# Altium footprint library JL_PCB.PCBLIB: 1129 footprints (part 55 of 72)
Each footprint in its own frame and in the unit in brackets; x right, y up, seen from the top. Pads: shape width x height; smd on the part's side, far side on the other; paste and mask are expansions set on the pad; w line width, h text height; cw(c..) or ccw(c..) is an arc to the next point about the centre after c.
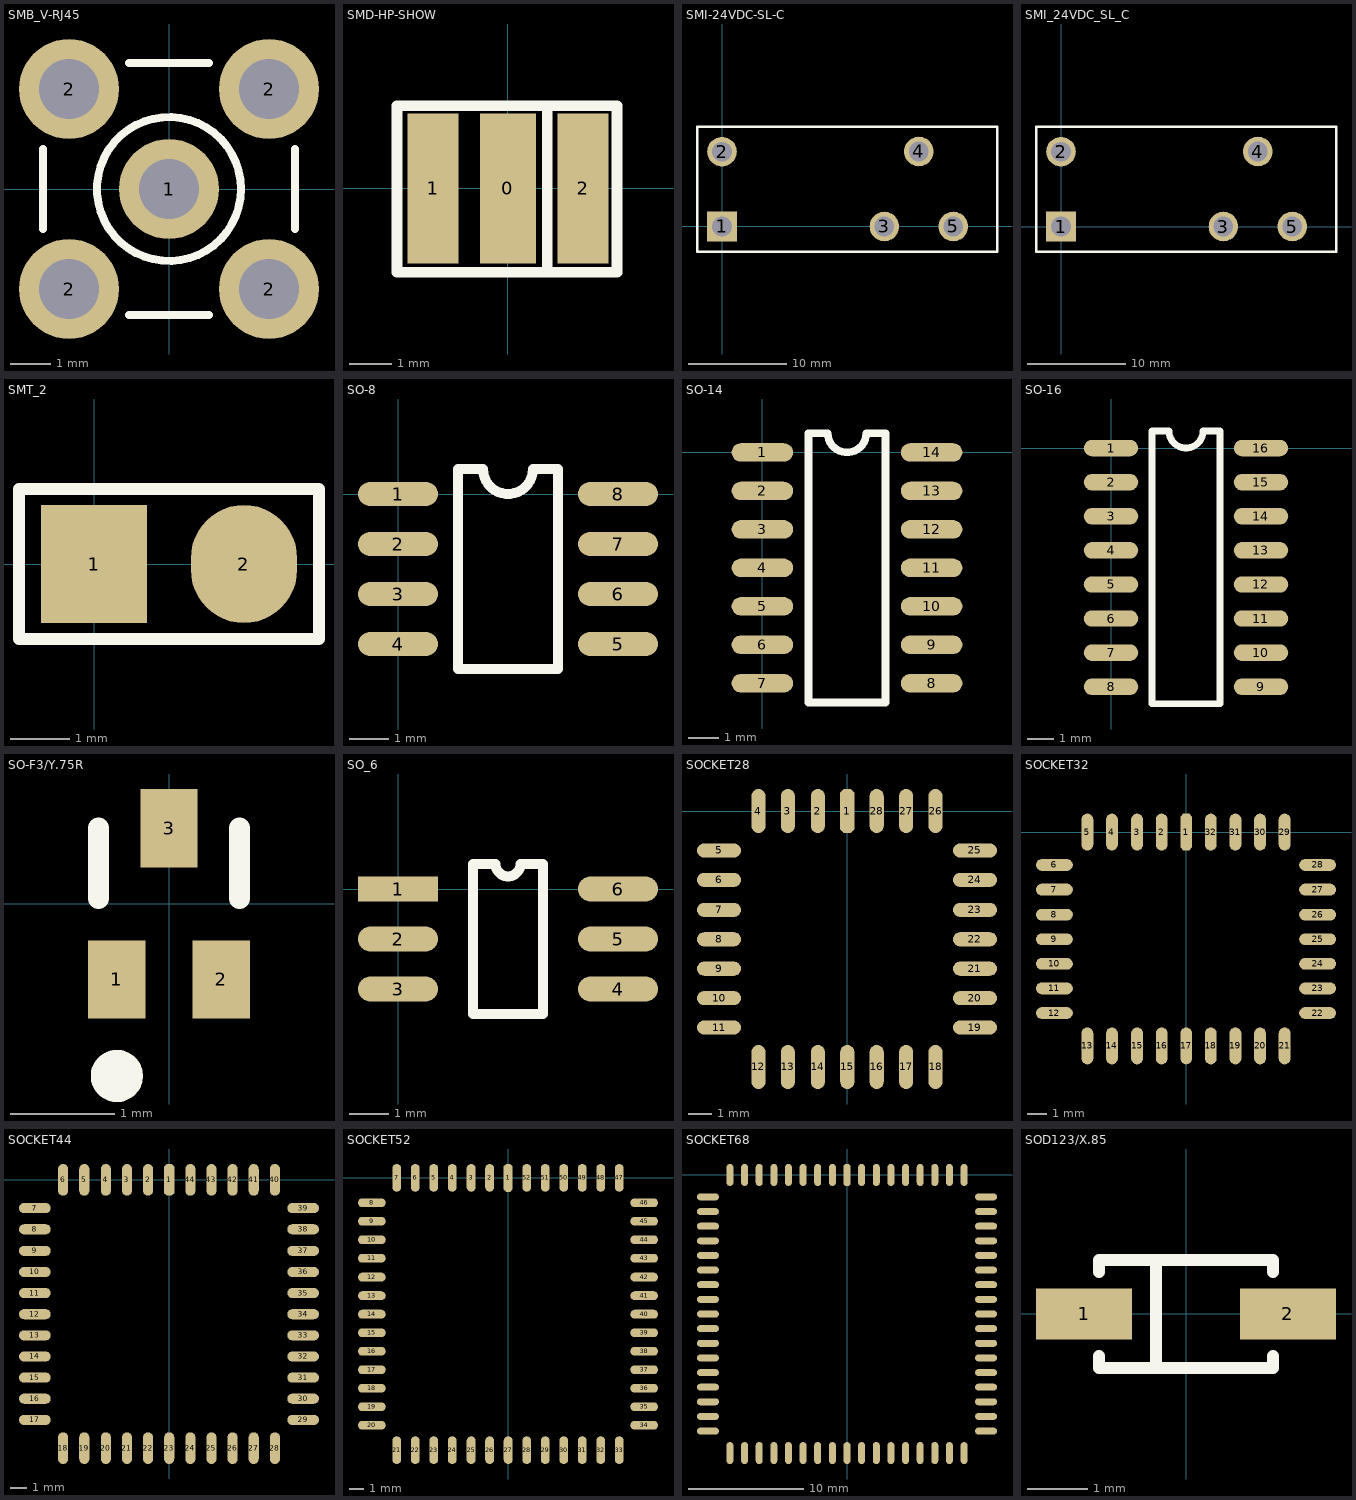
[diagram p54: the footprints below, top view; thin cyan lines are the x and y axes]

## SMB_V-RJ45 [mm] "Connector; SMB Straight"
pads (5):
  round 2.5 hole 1.5: 1(0,0) 2(-2.5,-2.5) 2(-2.5,2.5) 2(2.5,-2.5) 2(2.5,2.5)
TopOverlay:
  circle w0.2: c0,0 r1.8
  lines w0.2: -3.15,-1 -3.15,1 ; -1,-3.15 1,-3.15 ; -1,3.15 1,3.15 ; 3.15,-1 3.15,1
Mechanical1:
  circle w0.025: c0,0 r0.2
  circle w0.025: c0,0 r1.05
  circle w0.025: c0,0 r1.8

## SMD-HP-SHOW [mm]
pads (3):
  rect 1.3x3.5 smd: 0(0,0)
  rect 1.2x3.5 smd: 1(-1.75,0) 2(1.75,0)
TopOverlay:
  lines w0.254: 0.917,-1.958 0.917,1.928 ; -2.588,-1.958 2.543,-1.958 2.543,1.928 -2.588,1.928 -2.588,-1.958
3D body "SMD-HP-1W.STEP": height 2.03, standoff 0, extent -1.747,-1.755 1.753,1.745

## SMI-24VDC-SL-C [mm]
pads (5):
  rect 3x3 hole 2: 1(0,0)
  round 3 hole 2: 2(0,7.6) 3(16.5,0) 4(20,7.62) 5(23.5,0)
TopOverlay:
  lines w0.254: -2.54,-2.54 27.94,-2.54 27.94,10.16 -2.54,10.16 -2.54,-2.54

## SMI_24VDC_SL_C [mm]
pads (5):
  rect 3x3 hole 2: 1(0,0)
  round 3 hole 2: 2(0,7.6) 3(16.5,0) 4(20,7.62) 5(23.5,0)
TopOverlay:
  lines w0.254: -2.54,-2.54 27.94,-2.54 27.94,10.16 -2.54,10.16 -2.54,-2.54

## SMT_2 [mm] "Connector; Header; 2 Position"
pads (2):
  rect 1.8x2 smd: 1(0,0)
  oval 1.8x2 smd: 2(2.54,0)
TopOverlay:
  lines w0.2: -1.27,-1.27 3.81,-1.27 3.81,1.27 -1.27,1.27 -1.27,-1.27

## SO-8 [mil]
pads (8):
  oval 80x24 smd: 1(0,0) 2(0,-50) 3(0,-100) 4(0,-150) 5(220,-150) 6(220,-100) 7(220,-50) 8(220,0)
TopOverlay:
  lines w10: 60,-175 160,-175 160,25 135,25 cw(c110,25) 85,25 60,25 60,-175
3D body "SO-8.step": height 63.6, standoff 0.6, extent -10.91,-172 224.91,20.91

## SO-14 [mil]
pads (14):
  oval 80x24 smd: 1(0,0) 2(0,-50) 3(0,-100) 4(0,-150) 5(0,-200) 6(0,-250) 7(0,-300) 8(220,-300) 9(220,-250) 10(220,-200) 11(220,-150) 12(220,-100) 13(220,-50) 14(220,0)
TopOverlay:
  lines w10: 60,-325 60,25 85,25 ccw(c110,25) 135,25 160,25 160,-325 60,-325
3D body "SOIC14.STEP": height 76.77, standoff 0, extent -18.41,-321.26 220,21.26

## SO-16 [mil]
pads (16):
  oval 80x24 smd: 1(0,0) 2(0,-50) 3(0,-100) 4(0,-150) 5(0,-200) 6(0,-250) 7(0,-300) 8(0,-350) 9(220,-350) 10(220,-300) 11(220,-250) 12(220,-200) 13(220,-150) 14(220,-100) 15(220,-50) 16(220,0)
TopOverlay:
  lines w10: 60,-375 60,25 85,25 ccw(c110,25) 135,25 160,25 160,-375 60,-375
3D body "SOIC16.STEP": height 76.77, standoff 0, extent -12,-377 226.41,28.51

## SO-F3/Y.75R [mm] "SC-89; 3 Flat Leads; Body 1.6 x 1.6 x 0.7 mm, inc leads (LxWxH typ)"
height 0.8
pads (3):
  rect 0.55x0.75 smd: 1(-0.5,-0.725) 2(0.5,-0.725) 3(0,0.725)
TopOverlay:
  circle w0.25: c-0.5,-1.65 r0.125
  lines w0.2: -0.676,0.05 -0.676,0.725 ; 0.675,0.05 0.675,0.725

## SO_6 [mil]
pads (6):
  rect 80x25 smd: 1(0,0)
  oval 80x25 smd: 2(0,-50) 3(0,-100) 4(220,-100) 5(220,-50) 6(220,0)
TopOverlay:
  lines w10: 75,-125 145,-125 145,25 122.5,25 cw(c110,25) 97.5,25 75,25 75,-125

## SOCKET28 [mil]
pads (28):
  oct 24x75 smd: 1(0,0)
  oval 24x75 smd: 2(-50,0) 3(-101,0) 4(-151,0) 12(-151,-435) 13(-101,-435) 14(-50,-435) 15(0,-435) 16(50,-435) 17(100,-435) 18(150,-435) 26(150,0) 27(100,0) 28(50,0)
  oval 75x24 smd: 5(-218,-67) 6(-218,-117) 7(-218,-168) 8(-218,-218) 9(-218,-268) 10(-218,-318) 11(-218,-368) 19(217,-368) 20(217,-318) 21(217,-268) 22(217,-218) 23(217,-168) 24(217,-117) 25(217,-67)

## SOCKET32 [mil]
pads (32):
  oct 24x75 smd: 1(0,0)
  oval 24x75 smd: 2(-50,0) 3(-100,0) 4(-151,0) 5(-201,0) 13(-201,-435) 14(-151,-435) 15(-100,-435) 16(-50,-435) 17(0,-435) 18(50,-435) 19(100,-435) 20(150,-435) 21(200,-435) 29(200,0) 30(150,0) 31(100,0) 32(50,0)
  oval 75x24 smd: 6(-268,-67) 7(-268,-117) 8(-268,-168) 9(-268,-218) 10(-268,-268) 11(-268,-318) 12(-268,-368) 22(267,-368) 23(267,-318) 24(267,-268) 25(267,-218) 26(267,-168) 27(267,-117) 28(267,-67)

## SOCKET44 [mil]
pads (44):
  oct 24x75 smd: 1(0,0)
  oval 24x75 smd: 2(-50,0) 3(-100,0) 4(-150,0) 5(-201,0) 6(-251,0) 18(-251,-635) 19(-201,-635) 20(-150,-635) 21(-100,-635) 22(-50,-635) 23(0,-635) 24(50,-635) 25(100,-635) 26(150,-635) 27(200,-635) 28(250,-635) 40(250,0) 41(200,0) 42(150,0) 43(100,0) 44(50,0)
  oval 75x24 smd: 7(-318,-67) 8(-318,-117) 9(-318,-168) 10(-318,-218) 11(-318,-268) 12(-318,-318) 13(-318,-368) 14(-318,-418) 15(-318,-468) 16(-318,-518) 17(-318,-568) 29(317,-568) 30(317,-518) 31(317,-468) 32(317,-418) 33(317,-368) 34(317,-318) 35(317,-268) 36(317,-218) 37(317,-168) 38(317,-117) 39(317,-67)

## SOCKET52 [mil]
pads (52):
  oct 24x75 smd: 1(0,0)
  oval 24x75 smd: 2(-50,0) 3(-100,0) 4(-151,0) 5(-201,0) 6(-251,0) 7(-301,0) 21(-301,-735) 22(-251,-735) 23(-201,-735) 24(-151,-735) 25(-100,-735) 26(-50,-735) 27(0,-735) 28(50,-735) 29(100,-735) 30(150,-735) 31(200,-735) 32(250,-735) 33(300,-735) 47(300,0) 48(250,0) 49(200,0) 50(150,0) 51(100,0) 52(50,0)
  oval 75x24 smd: 8(-368,-67) 9(-368,-117) 10(-368,-167) 11(-368,-217) 12(-368,-268) 13(-368,-318) 14(-368,-368) 15(-368,-418) 16(-368,-468) 17(-368,-518) 18(-368,-568) 19(-368,-618) 20(-368,-668) 34(367,-668) 35(367,-618) 36(367,-568) 37(367,-518) 38(367,-468) 39(367,-418) 40(367,-368) 41(367,-318) 42(367,-268) 43(367,-217) 44(367,-167) 45(367,-117) 46(367,-67)

## SOCKET68 [mil]
pads (68):
  oct 24x75 smd: 1(0,0)
  oval 24x75 smd: 2(-50,0) 3(-100,0) 4(-150,0) 5(-200,0) 6(-250,0) 7(-300,0) 8(-350,0) 9(-400,0) 27(-400,-950) 28(-350,-950) 29(-300,-950) 30(-250,-950) 31(-200,-950) 32(-150,-950) 33(-100,-950) 34(-50,-950) 35(0,-950) 36(50,-950) 37(100,-950) 38(150,-950) 39(200,-950) 40(250,-950) 41(300,-950) 42(350,-950) 43(400,-950) 61(400,0) 62(350,0) 63(300,0) 64(250,0) 65(200,0) 66(150,0) 67(100,0) 68(50,0)
  oval 75x24 smd: 10(-475,-75) 11(-475,-125) 12(-475,-175) 13(-475,-225) 14(-475,-275) 15(-475,-325) 16(-475,-375) 17(-475,-425) 18(-475,-475) 19(-475,-525) 20(-475,-575) 21(-475,-625) 22(-475,-675) 23(-475,-725) 24(-475,-775) 25(-475,-825) 26(-475,-875) 44(475,-875) 45(475,-825) 46(475,-775) 47(475,-725) 48(475,-675) 49(475,-625) 50(475,-575) 51(475,-525) 52(475,-475) 53(475,-425) 54(475,-375) 55(475,-325) 56(475,-275) 57(475,-225) 58(475,-175) 59(475,-125) 60(475,-75)

## SOD123/X.85 [mm] "SOD-123; 2 Leads; Body 2.7 x 1.6 mm, (LxW)"
height 1.35
pads (2):
  rect 1.6x0.85 smd: 1(-1.7,0) 2(1.7,0)
TopOverlay:
  lines w0.2: -1.45,-0.7 -1.45,-0.9 1.45,-0.9 1.45,-0.7 ; -1.45,0.7 -1.45,0.9 1.45,0.9 1.45,0.7 ; -0.5,-0.9 -0.5,0.9